# Altium footprint library Connector-Header.PcbLib: 166 footprints (part 4 of 11)
Each footprint in its own frame and in the unit in brackets; x right, y up, seen from the top. Pads: shape width x height; smd on the part's side, far side on the other; paste and mask are expansions set on the pad; w line width, h text height; cw(c..) or ccw(c..) is an arc to the next point about the centre after c.
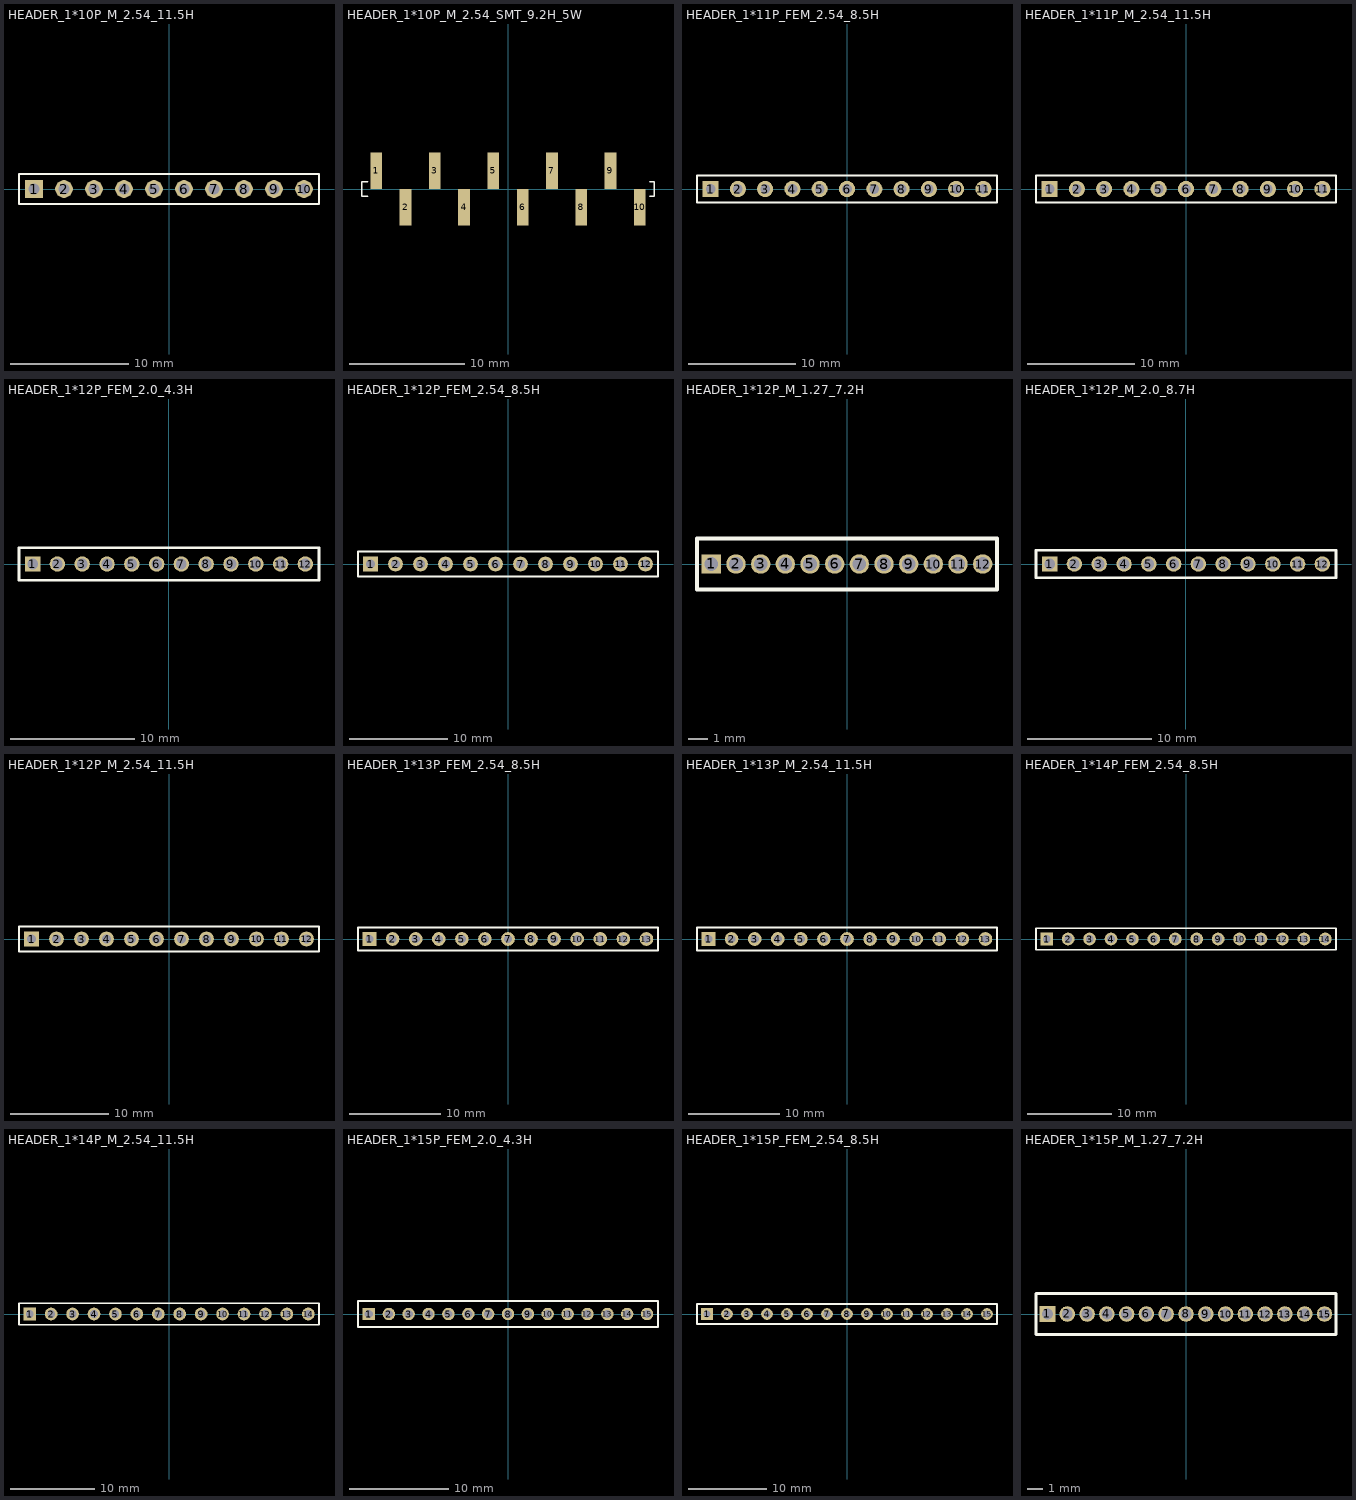
[diagram p3: the footprints below, top view; thin cyan lines are the x and y axes]

## HEADER_1*10P_M_2.54_11.5H [mm] "Connector; Header; 10 Position"
pads (10):
  rect 1.5x1.5 hole 0.9: 1(-11.43,0)
  round 1.5 hole 0.9: 2(-8.89,0) 3(-6.35,0) 4(-3.81,0) 5(-1.27,0) 6(1.27,0) 7(3.81,0) 8(6.35,0) 9(8.89,0) 10(11.43,0)
Top Overlay:
  lines w0.2: -12.7,-1.27 12.7,-1.27 12.7,1.27 -10.795,1.27 -12.7,1.27 -12.7,-1.27
3D body "PinHeader_1x10_P2.54mm_Vertical.step": height 8.54, standoff -3, extent -12.7,-1.27 12.7,1.27

## HEADER_1*10P_M_2.54_SMT_9.2H_5W [mm]
pads (10):
  rect 1.02x3.17 smd: 1(-11.43,1.585) 2(-8.89,-1.585) 3(-6.35,1.585) 4(-3.81,-1.585) 5(-1.27,1.585) 6(1.27,-1.585) 7(3.81,1.585) 8(6.35,-1.585) 9(8.89,1.585) 10(11.43,-1.585)
Top Overlay:
  lines w0.152: -12.192,-0.635 -12.7,-0.635 ; -12.192,0.635 -12.7,0.635 ; 12.319,-0.635 12.7,-0.635 12.7,0.635 12.319,0.635 ; -12.7,-0.635 -12.7,0.635 ; -12.7,-0.635 -12.7,0.635

## HEADER_1*11P_FEM_2.54_8.5H [mm] "Connector; Header; 11 Position"
pads (11):
  rect 1.5x1.5 hole 0.9: 1(-12.7,0)
  round 1.5 hole 0.9: 2(-10.16,0) 3(-7.62,0) 4(-5.08,0) 5(-2.54,0) 6(0,0) 7(2.54,0) 8(5.08,0) 9(7.62,0) 10(10.16,0) 11(12.7,0)
Top Overlay:
  lines w0.2: -13.97,-1.27 13.97,-1.27 13.97,1.27 -12.065,1.27 -13.97,1.27 -13.97,-1.27
3D body "PinSocket_1x11_P2.54mm_Vertical.step": height 7, standoff -3.1, extent -13.97,-1.27 13.97,1.27

## HEADER_1*11P_M_2.54_11.5H [mm] "Connector; Header; 11 Position"
pads (11):
  rect 1.5x1.5 hole 0.9: 1(-12.7,0)
  round 1.5 hole 0.9: 2(-10.16,0) 3(-7.62,0) 4(-5.08,0) 5(-2.54,0) 6(0,0) 7(2.54,0) 8(5.08,0) 9(7.62,0) 10(10.16,0) 11(12.7,0)
Top Overlay:
  lines w0.2: 13.945,-1.27 -13.97,-1.27 -13.97,1.27 -12.065,1.27 13.945,1.27 ; 13.97,-1.27 13.97,1.27
3D body "PinHeader_1x11_P2.54mm_Vertical.step": height 8.54, standoff -3, extent -13.97,-1.27 13.97,1.27

## HEADER_1*12P_FEM_2.0_4.3H [mm]
pads (12):
  rect 1.25x1.25 hole 0.85: 1(-11,0)
  round 1.25 hole 0.85: 2(-9,0) 3(-7,0) 4(-5,0) 5(-3,0) 6(-1,0) 7(1,0) 8(3,0) 9(5,0) 10(7,0) 11(9,0) 12(11,0)
Top Overlay:
  lines w0.203: -12.1,-1.3 -12.1,1.3 12.1,1.3 12.1,-1.3 -12.1,-1.3

## HEADER_1*12P_FEM_2.54_8.5H [mm] "Connector; Header; 12 Position"
pads (12):
  rect 1.5x1.5 hole 0.9: 1(-13.97,0)
  round 1.5 hole 0.9: 2(-11.43,0) 3(-8.89,0) 4(-6.35,0) 5(-3.81,0) 6(-1.27,0) 7(1.27,0) 8(3.81,0) 9(6.35,0) 10(8.89,0) 11(11.43,0) 12(13.97,0)
Top Overlay:
  lines w0.2: -15.24,-1.27 15.24,-1.27 15.24,1.27 -13.335,1.27 -15.24,1.27 -15.24,-1.27
3D body "PinSocket_1x12_P2.54mm_Vertical.step": height 7, standoff -3.1, extent -15.24,-1.27 15.24,1.27

## HEADER_1*12P_M_1.27_7.2H [mm]
pads (12):
  rect 1x1 hole 0.7: 1(-6.985,0)
  round 1 hole 0.7: 2(-5.715,0) 3(-4.445,0) 4(-3.175,0) 5(-1.905,0) 6(-0.635,0) 7(0.635,0) 8(1.905,0) 9(3.175,0) 10(4.445,0) 11(5.715,0) 12(6.985,0)
Top Overlay:
  lines w0.203: -7.722,-1.321 7.722,-1.321 7.722,1.321 -7.722,1.321 -7.722,-1.321

## HEADER_1*12P_M_2.0_8.7H [mm]
pads (12):
  rect 1.25x1.25 hole 0.85: 1(-11,0)
  round 1.25 hole 0.85: 2(-9,0) 3(-7,0) 4(-5,0) 5(-3,0) 6(-1,0) 7(1,0) 8(3,0) 9(5,0) 10(7,0) 11(9,0) 12(11,0)
Top Overlay:
  lines w0.203: -12.1,-1.1 -12.1,1.1 12.1,1.1 12.1,-1.1 -12.1,-1.1

## HEADER_1*12P_M_2.54_11.5H [mm] "Connector; Header; 12 Position"
pads (12):
  rect 1.5x1.5 hole 0.9: 1(-13.97,0)
  round 1.5 hole 0.9: 2(-11.43,0) 3(-8.89,0) 4(-6.35,0) 5(-3.81,0) 6(-1.27,0) 7(1.27,0) 8(3.81,0) 9(6.35,0) 10(8.89,0) 11(11.43,0) 12(13.97,0)
Top Overlay:
  lines w0.2: -15.24,-1.27 -15.24,1.27 -13.335,1.27 15.24,1.27 15.24,-1.27 -15.24,-1.27
3D body "PinHeader_1x12_P2.54mm_Vertical.step": height 8.54, standoff -3, extent -15.24,-1.27 15.24,1.27

## HEADER_1*13P_FEM_2.54_8.5H [mm] "Connector; Header; 13 Position"
pads (13):
  rect 1.5x1.5 hole 0.9: 1(-15.24,0)
  round 1.5 hole 0.9: 2(-12.7,0) 3(-10.16,0) 4(-7.62,0) 5(-5.08,0) 6(-2.54,0) 7(0,0) 8(2.54,0) 9(5.08,0) 10(7.62,0) 11(10.16,0) 12(12.7,0) 13(15.24,0)
Top Overlay:
  lines w0.2: -16.51,-1.27 16.51,-1.27 16.51,1.27 -14.605,1.27 -16.51,1.27 -16.51,-1.27
3D body "PinSocket_1x13_P2.54mm_Vertical.step": height 7, standoff -3.1, extent -16.51,-1.27 16.51,1.27

## HEADER_1*13P_M_2.54_11.5H [mm] "Connector; Header; 13 Position"
pads (13):
  rect 1.5x1.5 hole 0.9: 1(-15.24,0)
  round 1.5 hole 0.9: 2(-12.7,0) 3(-10.16,0) 4(-7.62,0) 5(-5.08,0) 6(-2.54,0) 7(0,0) 8(2.54,0) 9(5.08,0) 10(7.62,0) 11(10.16,0) 12(12.7,0) 13(15.24,0)
Top Overlay:
  lines w0.2: -16.51,-1.27 16.51,-1.27 16.51,1.27 -14.605,1.27 -16.51,1.27 -16.51,-1.27
3D body "PinHeader_1x13_P2.54mm_Vertical.step": height 8.54, standoff -3, extent -16.51,-1.27 16.51,1.27

## HEADER_1*14P_FEM_2.54_8.5H [mm] "Connector; Header; 14 Position"
pads (14):
  rect 1.5x1.5 hole 0.9: 1(-16.51,0)
  round 1.5 hole 0.9: 2(-13.97,0) 3(-11.43,0) 4(-8.89,0) 5(-6.35,0) 6(-3.81,0) 7(-1.27,0) 8(1.27,0) 9(3.81,0) 10(6.35,0) 11(8.89,0) 12(11.43,0) 13(13.97,0) 14(16.51,0)
Top Overlay:
  lines w0.2: -17.78,-1.27 -17.78,1.27 -15.875,1.27 17.78,1.27 17.78,-1.27 -17.78,-1.27
3D body "PinSocket_1x14_P2.54mm_Vertical.step": height 7, standoff -3.1, extent -17.78,-1.27 17.78,1.27

## HEADER_1*14P_M_2.54_11.5H [mm] "Connector; Header; 14 Position"
pads (14):
  rect 1.5x1.5 hole 0.9: 1(-16.51,0)
  round 1.5 hole 0.9: 2(-13.97,0) 3(-11.43,0) 4(-8.89,0) 5(-6.35,0) 6(-3.81,0) 7(-1.27,0) 8(1.27,0) 9(3.81,0) 10(6.35,0) 11(8.89,0) 12(11.43,0) 13(13.97,0) 14(16.51,0)
Top Overlay:
  lines w0.2: -17.78,-1.27 -17.78,1.27 -15.875,1.27 17.78,1.27 17.78,-1.27 -17.78,-1.27
3D body "PinHeader_1x14_P2.54mm_Vertical.step": height 8.54, standoff -3, extent -17.78,-1.27 17.78,1.27

## HEADER_1*15P_FEM_2.0_4.3H [mm]
pads (15):
  rect 1.25x1.25 hole 0.85: 1(-14,0)
  round 1.25 hole 0.85: 2(-12,0) 3(-10,0) 4(-8,0) 5(-6,0) 6(-4,0) 7(-2,0) 8(0,0) 9(2,0) 10(4,0) 11(6,0) 12(8,0) 13(10,0) 14(12,0) 15(14,0)
Top Overlay:
  lines w0.203: -15.1,-1.3 15.1,-1.3 15.1,1.3 -15.1,1.3 -15.1,-1.3

## HEADER_1*15P_FEM_2.54_8.5H [mm] "Connector; Header; 15 Position"
pads (15):
  rect 1.5x1.5 hole 0.9: 1(-17.78,0)
  round 1.5 hole 0.9: 2(-15.24,0) 3(-12.7,0) 4(-10.16,0) 5(-7.62,0) 6(-5.08,0) 7(-2.54,0) 8(0,0) 9(2.54,0) 10(5.08,0) 11(7.62,0) 12(10.16,0) 13(12.7,0) 14(15.24,0) 15(17.78,0)
Top Overlay:
  lines w0.2: -19.05,-1.27 -19.05,1.27 -17.145,1.27 19.05,1.27 19.05,-1.27 -19.05,-1.27
3D body "PinSocket_1x15_P2.54mm_Vertical.step": height 7, standoff -3.1, extent -19.05,-1.27 19.05,1.27

## HEADER_1*15P_M_1.27_7.2H [mm]
pads (15):
  rect 1x1 hole 0.7: 1(-8.89,0)
  round 1 hole 0.7: 2(-7.62,0) 3(-6.35,0) 4(-5.08,0) 5(-3.81,0) 6(-2.54,0) 7(-1.27,0) 8(0,0) 9(1.27,0) 10(2.54,0) 11(3.81,0) 12(5.08,0) 13(6.35,0) 14(7.62,0) 15(8.89,0)
Top Overlay:
  lines w0.203: -9.627,-1.321 9.627,-1.321 9.627,1.321 -9.627,1.321 -9.627,-1.321